# Altium footprint library UP-ROBOT Other(2012-07-12).PcbLib: 29 footprints (part 1 of 2)
Each footprint in its own frame and in the unit in brackets; x right, y up, seen from the top. Pads: shape width x height; smd on the part's side, far side on the other; paste and mask are expansions set on the pad; w line width, h text height; cw(c..) or ccw(c..) is an arc to the next point about the centre after c.
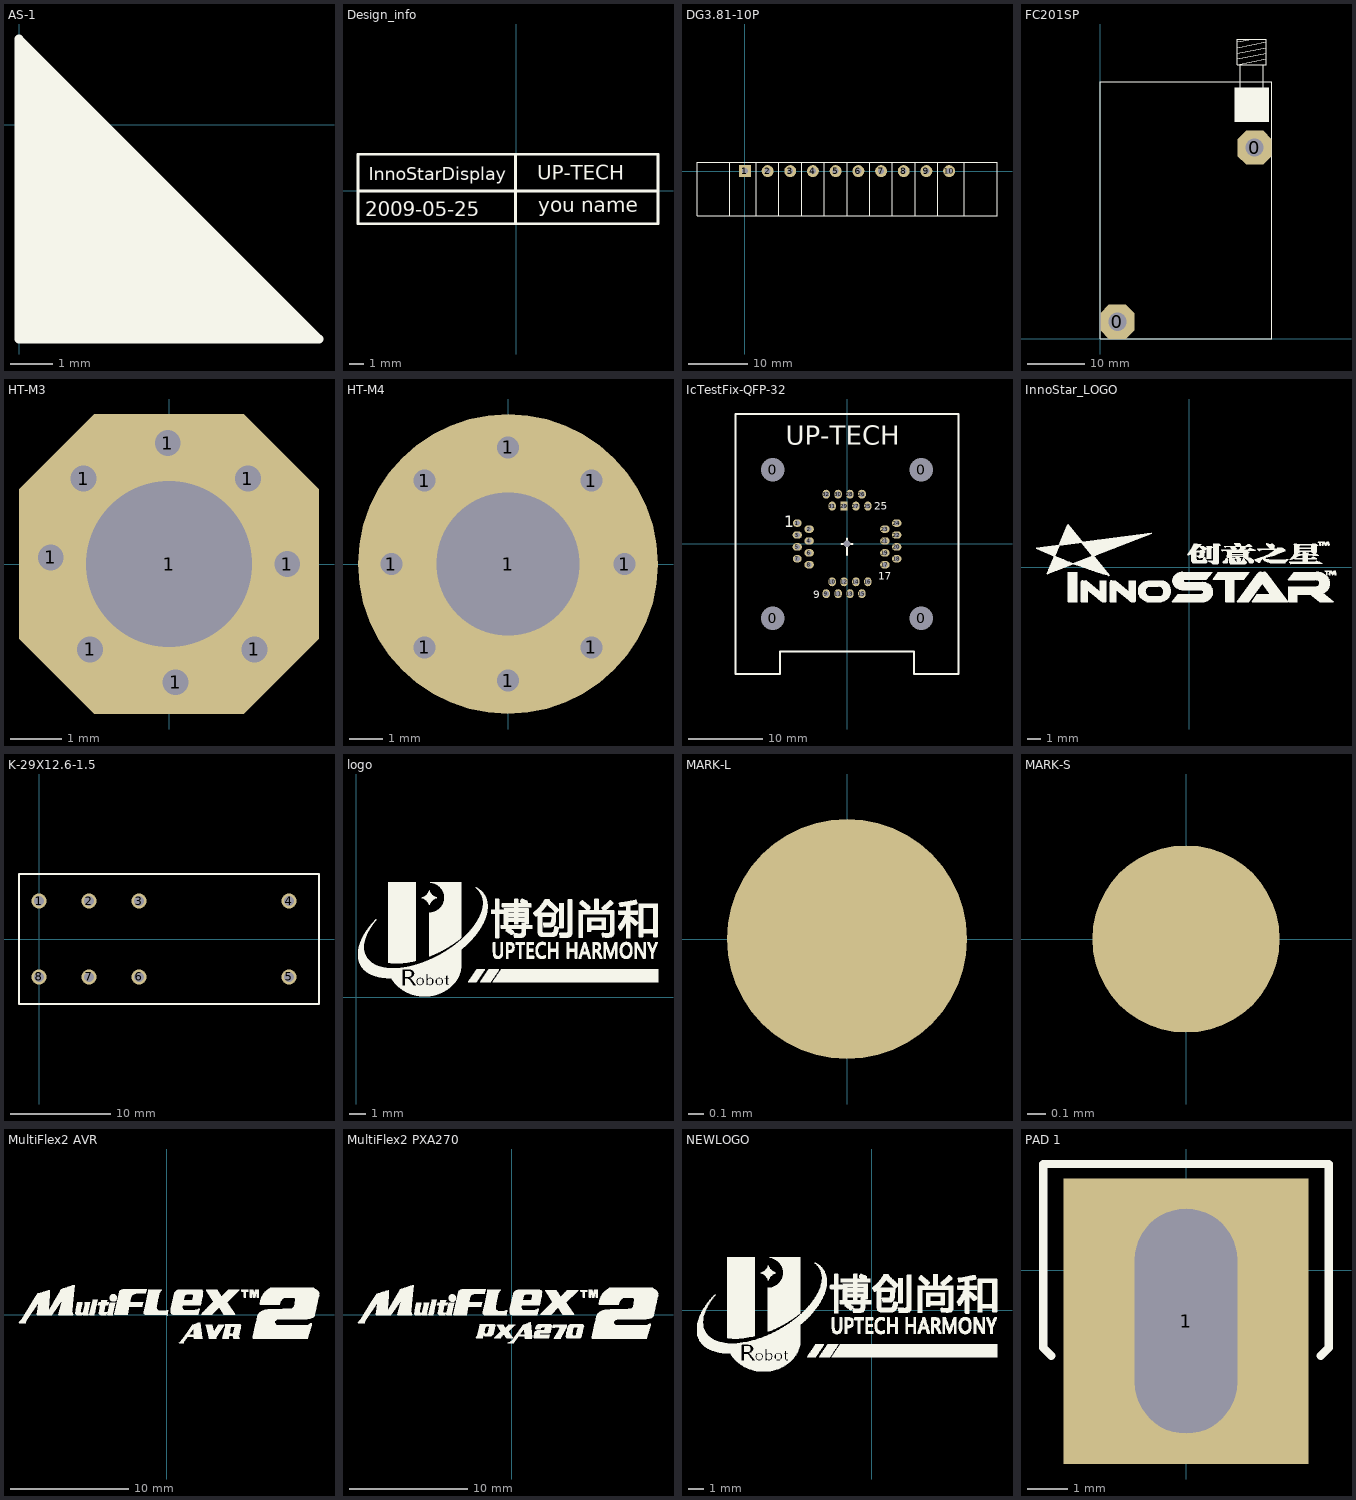
[diagram p0: the footprints below, top view; thin cyan lines are the x and y axes]

## AS-1 [mm] "对齐标志"
Top Overlay:
  rectangle: 0,1.6 0.2,1.8
  rectangle: 6.6,-5 6.8,-4.7
  rectangle: 6.4,-5 6.6,-4.6
  rectangle: 6.1,-5 6.4,-4.4
  rectangle: 5.5,-5 6.1,-4.1
  rectangle: 4.9,-5 5.6,-3.6
  rectangle: 4.3,-5 5,-2.9
  rectangle: 0,-5 0.6,1.4
  rectangle: 0.6,-5 1.5,0.5
  rectangle: 0.4,0.1 1.1,0.9
  rectangle: 1.4,-5 2.2,-0.1
  rectangle: 2.1,-5 2.9,-0.8
  rectangle: 2.8,-5 3.5,-1.5
  rectangle: 3.5,-5 3.9,-1.9
  rectangle: 3.8,-5 4.3,-2.2
  rectangle: 0,-0.3 0.2,-0.2
  lines w0.203: 0,-5 0,0 0,2 7,-5 5,-5 4.5,-5 0,-5
  lines w0.45: 0.2,1.5 6.4,-4.7

## Design_info [mm]
height 12.7
Top Overlay:
  lines w0.203: -11,0 9.828,0 ; -0.078,-2.286 -0.078,2.54 ; -11,-2.286 -11,2.54 9.828,2.54 9.828,-2.286 -11,-2.286
  text "you name" at 1.5,-1.5 h1.02
  text "2009-05-25" at -10.492,-1.778 h1.02
  text "UP-TECH" at 1.446,0.762 h1.02
  text "InnoStarDisplay" at -10.25,0.75 h0.89

## DG3.81-10P [mm]
pads (10):
  rect 2x2 hole 1: 1(0,0)
  round 2 hole 1: 2(3.81,0) 3(7.62,0) 4(11.43,0) 5(15.24,0) 6(19.05,0) 7(22.86,0) 8(26.67,0) 9(30.48,0) 10(34.29,0)
Top Overlay:
  lines w0.203: 5.715,-7.5 5.715,1.5 ; 9.525,-7.5 9.525,1.5 ; 13.335,-7.5 13.335,1.5 ; 17.145,-7.5 17.145,1.5 ; 20.955,-7.5 20.955,1.5 ; 24.765,-7.5 24.765,1.5 ; 28.575,-7.5 28.575,1.5 ; -2.555,-7.5 -2.555,1.5 ; -2.555,-7.5 -8.04,-7.5 -8.04,1.5 -2.555,1.5 ; -2.555,-7.5 1.905,-7.5 ; -2.555,1.5 1.905,1.5 ; 1.905,-7.5 1.905,1.5 ; 1.905,-7.5 32.385,-7.5 ; 1.905,1.5 17.145,1.5 ; 17.145,1.5 32.385,1.5 ; 32.385,-7.5 32.385,1.5 ; 32.385,-7.5 36.845,-7.5 ; 32.385,1.5 36.845,1.5 ; 36.845,-7.5 36.845,1.5 ; 36.845,-7.5 42.33,-7.5 42.33,1.5 36.845,1.5

## FC201SP [mm]
pads (2):
  oct 6x6 hole 3.2: 0(3,3) 0(27,33.5)
Top Overlay:
  rectangle: 23.5,38 26.5,44
  rectangle: 26.5,38 29.5,44
  lines w0.203: 24,49 29,50 ; 24,50 29,51 ; 24,51 29,52 ; 24,52 26.5,52.5 ; 24.5,44 24.5,48 29,48 29,52.5 ; 25,48 24,48 ; 28.5,44 28.5,48 ; 29,49 24,48 ; 24,48 24,52.5 ; 24,52.5 29,52.5 ; 24,52.5 29,52.5 ; 0,0 0,45 30,45 30,0 0,0

## HT-M3 [mil]
pads (9):
  round 40 hole 19.68: 1(-90,5) 1(-65,65) 1(-60,-65) 1(-1,92) 1(5,-90) 1(60,65) 1(65,-65) 1(90,0)
  oct 228.35x228.35 hole 125.98: 1(0,0)

## HT-M4 [mil]
pads (9):
  round 40 hole 26: 1(-137.8,0) 1(-98.43,-98.43) 1(-98.43,98.43) 1(0,-137.8) 1(0,137.8) 1(98.43,-98.43) 1(98.43,98.43) 1(137.8,0)
  round 354.33 hole 169.29: 1(0,0)

## IcTestFix-QFP-32 [mm]
pads (37):
  round 2.54 hole 3.2: 0(-10,10) 0(-10,-10) 0(10,-10) 0(10,10)
  oval 1.2x1 hole 0.7: 1(-6.7,2.8) 7(-6.7,-2)
  oval 1.27x1 hole 0.7: 2(-5.1,2) 3(-6.7,1.2) 4(-5.1,0.4) 5(-6.7,-0.4) 6(-5.1,-1.2) 8(-5.1,-2.8) 17(5.1,-2.8) 18(6.7,-2) 19(5.1,-1.2) 20(6.7,-0.4) 21(5.1,0.4) 22(6.7,1.2) 23(5.1,2) 24(6.7,2.8)
  oval 1x1.2 hole 0.7: 9(-2.8,-6.7) 10(-2,-5.1) 11(-1.2,-6.7) 12(-0.4,-5.1) 13(0.4,-6.7) 14(1.2,-5.1) 15(2,-6.7) 16(2.8,-5.1) 25(2.8,5.1) 27(1.2,5.1) 28(0.4,6.7) 30(-1.2,6.7) 31(-2,5.1) 32(-2.8,6.7)
  oval 1.1x1.2 hole 0.7: 26(2,6.7)
  rect 1x1.2 hole 0.7: 29(-0.4,5.1)
  round 0.762 hole 0.889: BMW(0,0)
Top Overlay:
  lines w0.254: -0.762,0 0.762,0 ; 0,-1.524 0,0.762 ; -15,-17.5 -9,-17.5 -9,-14.5 9,-14.5 9,-17.5 15,-17.5 15,17.5 -15,17.5 -15,-17.5
  text "25" at 3.651,4.603 h1.02
  text "1" at -8.422,2.246 h1.52
  text "9" at -4.518,-7.302 h1.02
  text "17" at 4.24,-4.81 h1.02
  text "UP-TECH" at -8.23,13.36 h2.54

## InnoStar_LOGO [mm]
Top Overlay:
  drawing of 4991 lines, arcs and shapes, not listed

## K-29X12.6-1.5 [mm]
pads (8):
  round 1.5 hole 1: 1(0,3.8) 2(5,3.8) 3(10,3.8) 4(25,3.8) 5(25,-3.8) 6(10,-3.8) 7(5,-3.8) 8(0,-3.8)
Top Overlay:
  lines w0.203: -2,-6.5 28,-6.5 28,6.5 -2,6.5 -2,-6.5

## logo [mm]
Top Overlay:
  drawing of 12467 lines, arcs and shapes, not listed

## MARK-L [mm]
pads (1):
  round 1.6 smd: ""(0,0)
Top Solder:
  circle w1.2: c0,0 r1

## MARK-S [mm]
pads (1):
  round 1 smd: ""(0,0)
Top Solder:
  circle w0.6: c0,0 r0.8

## MultiFlex2 AVR [mm]
Top Overlay:
  drawing of 3711 lines, arcs and shapes, not listed

## MultiFlex2 PXA270 [mm]
Top Overlay:
  drawing of 4328 lines, arcs and shapes, not listed

## NEWLOGO [mm]
Top Overlay:
  drawing of 3110 lines, arcs and shapes, not listed

## PAD 1 [mm]
pads (1):
  rect 6x7 hole 2.5 slot 5.5 at 90 deg: 1(0,-1.25)
Top Overlay:
  lines w0.203: -3.5,-1.75 -3.5,2.6 3.5,2.6 3.5,-1.9 3.3,-2.1 ; -3.5,-1.7 -3.5,-1.9 -3.3,-2.1 ; 3.3,-2.1 3.3,-2.1